# Altium footprint library discrete.PcbLib: 79 footprints (part 2 of 5)
Each footprint in its own frame and in the unit in brackets; x right, y up, seen from the top. Pads: shape width x height; smd on the part's side, far side on the other; paste and mask are expansions set on the pad; w line width, h text height; cw(c..) or ccw(c..) is an arc to the next point about the centre after c.
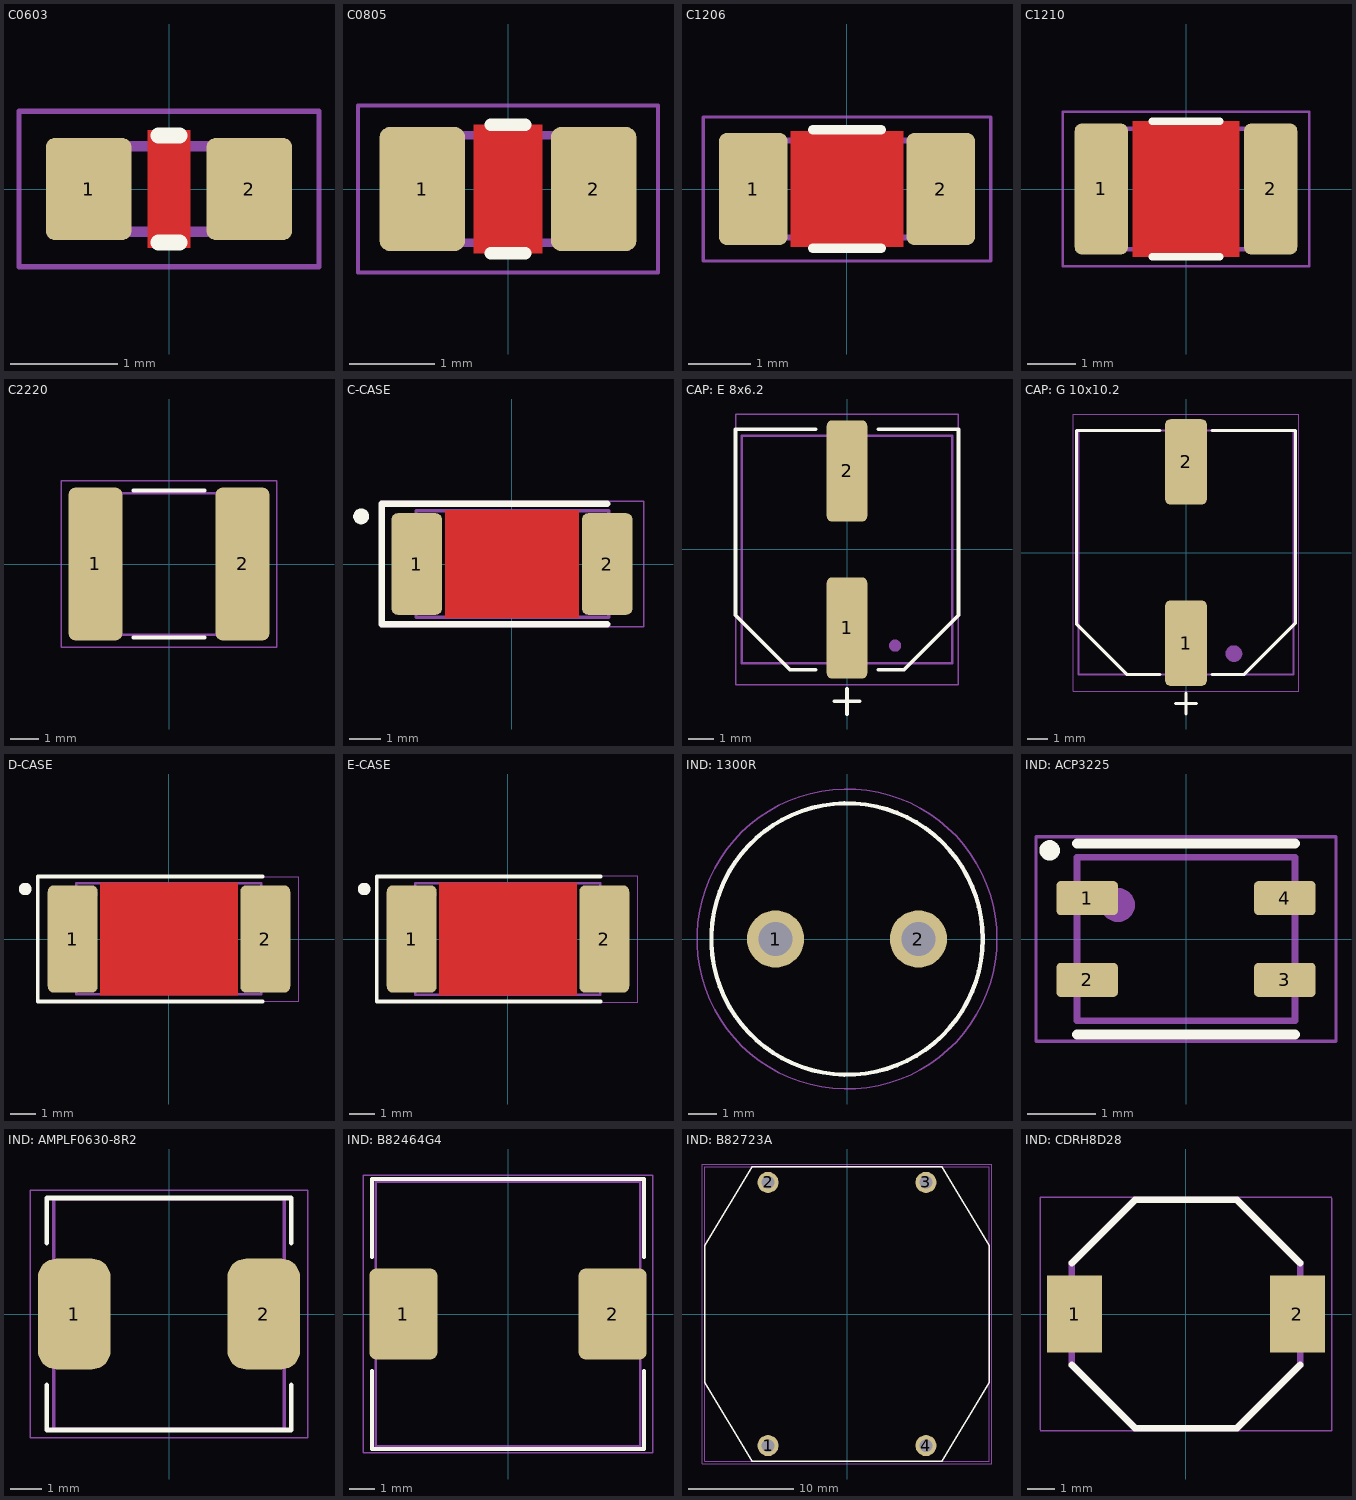
[diagram p1: the footprints below, top view; thin cyan lines are the x and y axes]

## C0603 [mm]
pads (2):
  rrect20% 0.8x0.95 smd: 1(-0.75,0) 2(0.75,0)
Top Layer:
  pour cut-out: 0.2,-0.55 0.2,0.55 -0.2,0.55 -0.2,-0.55
Top Overlay:
  lines w0.15: -0.1,-0.5 0.1,-0.5 ; -0.1,0.5 0.1,0.5
Top Assy:
  lines w0.1: -0.8,-0.4 0.8,-0.4 0.8,0.4 -0.8,0.4 -0.8,-0.4
  text ".Designator" at -0.626,-0.246 h0.5
Top Cortyard:
  lines w0.05: -1.4,-0.725 -1.4,0.725 1.4,0.725 1.4,-0.725 -1.4,-0.725
3D body "SW3dPS-0603 SMD Capacitor.STEP": height 0.3, standoff 0, extent -0.8,-0.4 0.8,0.4

## C0805 [mm]
pads (2):
  rrect25% 1x1.45 smd: 1(-1,0) 2(1,0)
Top Layer:
  pour cut-out: -0.4,0.75 -0.4,-0.75 0.4,-0.75 0.4,0.75
Top Overlay:
  lines w0.15: -0.2,-0.75 0.2,-0.75 ; -0.2,0.75 0.2,0.75
Top Assy:
  lines w0.1: -1.025,-0.625 -1.025,0.625 1,0.625 1,-0.625 -1.025,-0.625
  text ".Designator" at -0.85,-0.25 h0.5
Top Cortyard:
  lines w0.05: -1.75,-0.975 -1.75,0.975 1.75,0.975 1.75,-0.975 -1.75,-0.975
3D body "SW3dPS-0805 SMD Capacitor.STEP": height 0.78, standoff 0, extent -1,-0.625 1,0.625

## C1206 [mm]
pads (2):
  rrect25% 1.1x1.8 smd: 1(-1.5,0) 2(1.5,0)
Top Layer:
  pour cut-out: -0.9,0.925 -0.9,-0.925 0.9,-0.925 0.9,0.925
Top Overlay:
  lines w0.15: -0.55,-0.95 0.55,-0.95 ; -0.55,0.95 0.55,0.95
Top Assy:
  lines w0.1: -1.6,-0.775 -1.6,0.775 1.6,0.775 1.6,-0.775 -1.6,-0.775
  text ".Designator" at -1.125,-0.225 h0.5
Top Cortyard:
  lines w0.05: -2.3,-1.15 -2.3,1.15 2.3,1.15 2.3,-1.15 -2.3,-1.15
3D body "SW3dPS-1206 SMD Capacitor.STEP": height 1, standoff 0, extent -1.6,-0.8 1.6,0.8

## C1210 [mm]
pads (2):
  rrect25% 1.1x2.7 smd: 1(-1.75,0) 2(1.75,0)
Top Layer:
  pour cut-out: -1.1,1.4 -1.1,-1.4 1.1,-1.4 1.1,1.4
Top Overlay:
  lines w0.15: -0.7,-1.4 0.7,-1.4 ; -0.7,1.4 0.7,1.4
Top Assy:
  lines w0.1: -2,-1.244 2,-1.244 2,1.245 -2,1.245 -2,-1.244
  text ".Designator" at -1.525,-0.275 h0.5
Top Cortyard:
  lines w0.05: -2.55,-1.6 -2.55,1.6 2.55,1.6 2.55,-1.6 -2.55,-1.6
3D body "User Library-1210(3225M) Cap.STEP": height 1.7, standoff 0, extent -2,-1.244 2,1.245

## C2220 [mm]
pads (2):
  rrect25% 1.9x5.4 smd: 1(-2.6,0) 2(2.6,0)
Top Overlay:
  lines w0.15: -1.25,-2.6 1.25,-2.6 ; -1.25,2.6 1.25,2.6
Top Assy:
  lines w0.1: -2.85,-2.5 -2.85,2.5 2.85,2.5 2.85,-2.5 -2.85,-2.5
  text ".Designator" at -1.875,-0.292 h1
Top Cortyard:
  lines w0.05: -3.8,-2.95 3.8,-2.95 3.8,2.95 -3.8,2.95 -3.8,-2.95
3D body "User Library-CAPC5750X23.step": height 2.3, standoff 0, extent -2.85,-2.5 2.85,2.5

## C-CASE [mm]
pads (2):
  rrect25% 1.6x3.2 smd: 1(-3,0) 2(3,0)
Top Layer:
  pour cut-out: -2.1,1.7 -2.1,-1.7 2.1,-1.7 2.1,1.7
Top Overlay:
  circle w0.3: c-4.75,1.5 r0.1
  lines w0.2: 3,-1.9 -4.1,-1.9 -4.1,1.9 3,1.9
Top Assy:
  circle w0.3: c-2.5,1.1 r0.1
  lines w0.1: -3.025,-1.675 -3.025,1.675 3.05,1.675 3.05,-1.675 -3.025,-1.675
  text ".Designator" at -1.75,-0.225 h0.75
Top Cortyard:
  lines w0.05: -4.15,-1.975 4.15,-1.975 4.15,1.975 -4.15,1.975 -4.15,-1.975
3D body "User Library-AVX_C_CASE.STEP": height 2.7, standoff 0, extent -3.05,-1.675 3.05,1.675

## CAP: E 8x6.2 [mm] "Electrolytic SMD capacitor"
pads (2):
  rrect25% 1.6x4 smd: 1(0,-3.1) 2(0,3.1)
Top Overlay:
  lines w0.15: -1.25,-4.75 -2.25,-4.75 -4.4,-2.6 -4.4,4.75 -1.25,4.75 ; -0.5,-6 0.5,-6 ; 0,-6.5 0,-5.5 ; 1.25,-4.75 2.25,-4.75 4.4,-2.6 4.4,4.75 1.25,4.75
Top Assy:
  circle w0.254: c1.9,-3.8 r0.112
  lines w0.1: -4.15,-4.5 -4.15,4.5 4.15,4.5 4.15,-4.5 -4.15,-4.5
  text ".Designator" at -3.75,-0.283 h1.25
Top Cortyard:
  lines w0.05: -4.4,-5.35 4.4,-5.35 4.4,5.35 -4.4,5.35 -4.4,-5.35
3D body "User Library-ELEC_CAP_E_D8_L6_2.STEP": height 6.25, standoff 0.05, extent -4.15,-4.5 4.15,4.5

## CAP: G 10x10.2 [mm] "Electrolytic SMD capacitor"
pads (2):
  rrect25% 2x4.1 smd: 1(0,-4.35) 2(0,4.35)
Top Overlay:
  lines w0.15: -1.25,-5.85 -2.85,-5.85 -5.25,-3.45 -5.25,5.852 -1.25,5.852 ; -0.5,-7.25 0.5,-7.25 ; 0,-7.75 0,-6.75 ; 1.25,-5.85 2.8,-5.85 5.25,-3.4 5.25,5.85 1.25,5.85
Top Assy:
  circle w0.4: c2.3,-4.85 r0.2
  lines w0.1: -5.15,-5.85 -5.15,5.85 5.15,5.85 5.15,-5.85 -5.15,-5.85
  text ".Designator" at -4.1,-0.733 h1.25
Top Cortyard:
  lines w0.05: -5.4,-6.65 -5.4,6.65 5.4,6.65 5.4,-6.65 -5.4,-6.65
3D body "User Library-A3D-003-00015.STEP": height 10.2, standoff 0, extent -5.15,-5.85 5.15,5.85

## D-CASE [mm]
pads (2):
  rrect25% 2x4.3 smd: 1(-3.85,0) 2(3.85,0)
Top Layer:
  pour cut-out: -2.75,2.25 -2.75,-2.25 2.75,-2.25 2.75,2.25
Top Overlay:
  circle w0.3: c-5.75,2 r0.1
  lines w0.15: 3.75,-2.5 -5.25,-2.5 -5.25,2.5 3.75,2.5
Top Assy:
  circle w0.3: c-3.1,1.8 r0.1
  lines w0.1: -3.7,-2.2 -3.7,2.225 3.7,2.225 3.7,-2.2 -3.7,-2.2
  text ".Designator" at -1.925,-0.3 h0.75
Top Cortyard:
  lines w0.05: -5.2,-2.5 -5.2,2.5 5.2,2.5 5.2,-2.5 -5.2,-2.5
3D body "User Library-AVX_D_CASE.STEP": height 3.01, standoff 0, extent -3.7,-2.225 3.7,2.225

## E-CASE [mm] "Solid Tantalum Chip Capacitor, EIA Code 7343H (CASE-E)"
height 4
pads (2):
  rrect25% 2x4.3 smd: 1(-3.85,0) 2(3.85,0)
Top Layer:
  pour cut-out: -2.75,2.25 -2.75,-2.25 2.75,-2.25 2.75,2.25
Top Overlay:
  circle w0.3: c-5.75,2 r0.1
  lines w0.15: 3.7,-2.5 -5.25,-2.5 -5.25,2.5 3.7,2.5
Top Assy:
  circle w0.3: c-3.1,1.8 r0.1
  lines w0.1: -3.7,-2.225 -3.7,2.225 3.7,2.225 3.7,-2.225 -3.7,-2.225
  text ".Designator" at -1.95,-0.325 h0.75
Top Cortyard:
  lines w0.05: -5.2,-2.525 -5.2,2.525 5.2,2.525 5.2,-2.525 -5.2,-2.525
3D body "User Library-AVX_E_CASE.STEP": height 4.2, standoff 0, extent -3.7,-2.225 3.7,2.225

## IND: 1300R [mm]
height 13.5
pads (2):
  round 2 hole 1.2: 1(-2.5,0) 2(2.5,0)
Top Overlay:
  circle w0.15: c0,0 r4.75
Top Assy:
  circle w0.1: c0,0 r4.75
  text ".Designator" at -1.575,-0.092 h1
Top Cortyard:
  lines w0.05: 5.25,0 ccw(c0,0) 5.25,0
3D body "1300R.STEP": height 12.18, standoff -34.83, extent -5.594,-5.663 5.744,5.675

## IND: ACP3225 [mm]
height 2
pads (4):
  rrect25% 0.9x0.5 smd: 1(-1.45,0.6) 2(-1.45,-0.6) 3(1.45,-0.6) 4(1.45,0.6)
Top Overlay:
  circle w0.2: c-2,1.3 r0.05
  lines w0.15: -1.6,-1.4 1.6,-1.4 ; -1.6,1.4 1.6,1.4
Top Assy:
  circle w0.3: c-1,0.5 r0.1
  lines w0.1: -1.6,-1.2 -1.6,1.2 1.6,1.2 1.6,-1.2 -1.6,-1.2
  text ".Designator" at 0,0 h1
Top Cortyard:
  lines w0.05: -2.2,-1.5 2.2,-1.5 2.2,1.5 -2.2,1.5 -2.2,-1.5
3D body "User Library-ACP3225-1.STEP": height 1.91, standoff 0, extent -1.61,-1.25 1.61,1.25

## IND: AMPLF0630-8R2 [mm] "Inductor 8.2uH, 3.6А"
pads (2):
  rrect50% 2.3x3.5 smd: 1(-3,0) 2(3,0)
Top Overlay:
  lines w0.15: -3.875,-2.25 -3.875,-3.675 3.875,-3.675 3.875,-2.25 ; -3.875,2.25 -3.875,3.675 3.875,3.675 3.875,2.25
Top Assy:
  lines w0.1: -3.65,-3.65 3.65,-3.65 3.65,3.65 -3.65,3.65 -3.65,-3.65
  text ".Designator" at -1.95,-0.533 h1.25
Top Cortyard:
  lines w0.05: -4.4,-3.925 4.4,-3.925 4.4,3.925 -4.4,3.925 -4.4,-3.925
3D body: height 2.8, standoff 0, extent -3.65,-3.65 3.65,3.65

## IND: B82464G4 [mm]
height 16.8
pads (2):
  rrect20% 2.7x3.6 smd: 1(-4.15,0) 2(4.15,0)
Top Overlay:
  lines w0.15: -5.4,-2.25 -5.4,-5.35 5.4,-5.35 5.4,-2.25 ; -5.4,2.25 -5.4,5.35 5.4,5.35 5.4,2.25
Top Assy:
  lines w0.1: -5.25,-5.25 -5.25,5.25 5.25,5.25 5.25,-5.25 -5.25,-5.25
  text ".Designator" at -2.55,-0.558 h1.25
Top Cortyard:
  lines w0.05: -5.75,-5.5 5.75,-5.5 5.75,5.5 -5.75,5.5 -5.75,-5.5
3D body: height 4.8, standoff 0, extent -5.25,-5.25 5.25,5.25

## IND: B82723A [mm]
height 16.8
pads (4):
  round 2 hole 1.2: 1(-7.5,-12.5) 2(-7.5,12.5) 3(7.5,12.5) 4(7.5,-12.5)
Top Overlay:
  lines w0.15: -13.5,-6.5 -13.5,6.5 -9,14 9,14 13.5,6.5 13.5,-6.5 9,-14 -9,-14 -13.5,-6.5
Top Assy:
  lines w0.1: -13.5,-14 13.5,-14 13.5,14 -13.5,14 -13.5,-14
  text ".Designator" at -4.447,-1.816 h5
Top Cortyard:
  lines w0.05: -13.75,-14.25 13.75,-14.25 13.75,14.25 -13.75,14.25 -13.75,-14.25
3D body "B82723A.step": height 16.81, standoff -4, extent -13.5,-14 13.5,14

## IND: CDRH8D28 [mm]
height 3
pads (2):
  rect 2x2.8 smd: 1(-4.05,0) 2(4.05,0)
Top Overlay:
  lines w0.25: -4.15,-1.85 -1.85,-4.15 1.85,-4.15 4.15,-1.85 ; -4.15,1.85 -1.85,4.15 1.85,4.15 4.15,1.85
Top Assy:
  lines w0.25: -4.15,-1.85 -1.85,-4.15 1.85,-4.15 4.15,-1.85 4.15,1.85 1.85,4.15 -1.85,4.15 -4.15,1.85 -4.15,-1.85
  text ".Designator" at -1.85,-0.583 h1.25
Top Cortyard:
  lines w0.05: -5.3,-4.25 5.3,-4.25 5.3,4.2 ; -5.3,-4.2 -5.3,4.25 5.3,4.25
3D body "CDRH8D28.step": height 2.8, standoff 0, extent -4.35,-4 4.35,4